# Altium footprint library 二极管封装库.PcbLib: 222 footprints (part 8 of 14)
Each footprint in its own frame and in the unit in brackets; x right, y up, seen from the top. Pads: shape width x height; smd on the part's side, far side on the other; paste and mask are expansions set on the pad; w line width, h text height; cw(c..) or ccw(c..) is an arc to the next point about the centre after c.
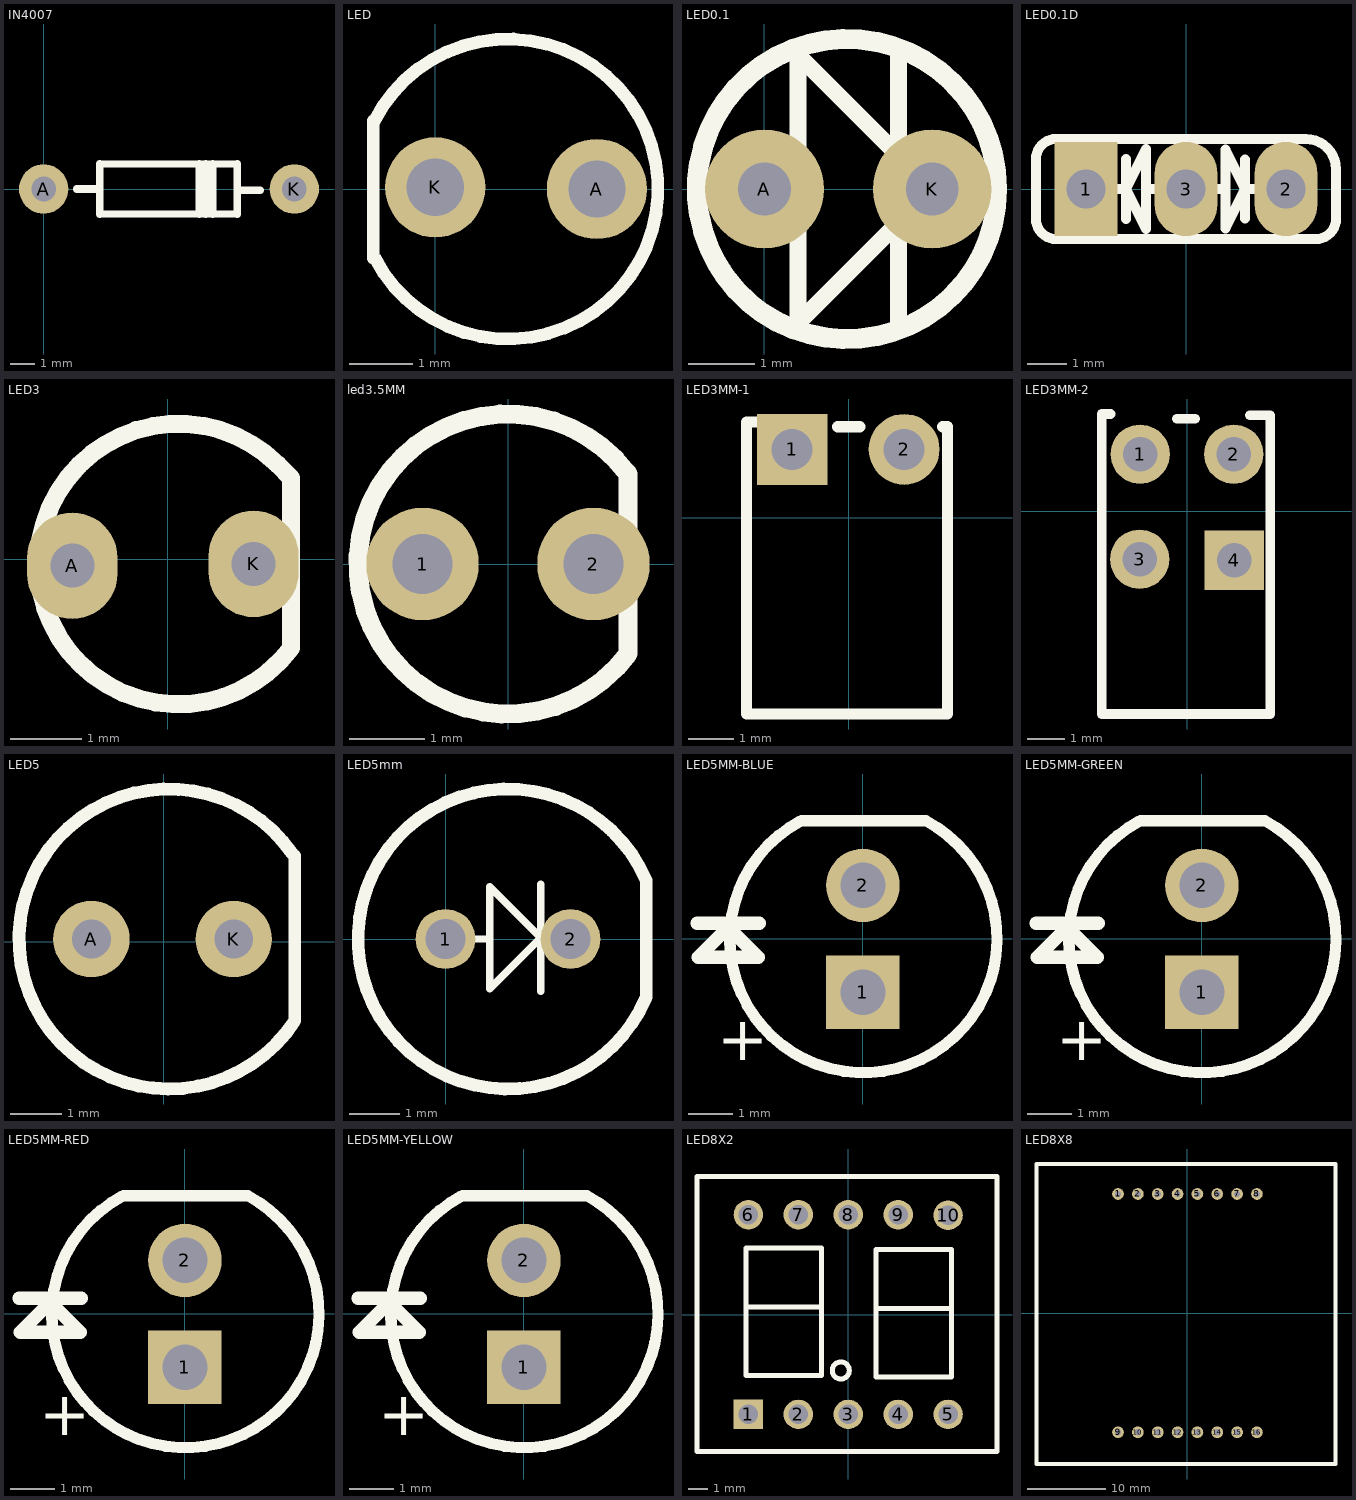
[diagram p7: the footprints below, top view; thin cyan lines are the x and y axes]

## IN4007 [mm]
pads (2):
  round 2 hole 1: A(0,0) K(10.16,0)
Top Overlay:
  lines w0.305: 1.35,0 2.282,0 ; 2.282,-1.016 2.282,1.016 ; 2.289,-1.007 7.841,-1.014 ; 2.289,1.007 7.841,1.014 ; 6.3,-1.016 6.3,1.016 ; 6.575,-1.016 6.575,1.016 ; 6.85,-1.016 6.85,1.016 ; 7.853,-1.016 7.853,1.016 ; 7.853,-0.05 8.785,-0.05

## LED [mil]
pads (2):
  round 62 hole 35.43: A(100,0) K(0,1)
Top Overlay:
  lines w7.87: -38.34,-42.75 -38.34,42.08 ; -37.62,42.22 cw(c45,0) -37.34,-42.75

## LED0.1 [mm]
pads (2):
  round 1.8 hole 0.8: A(0,0) K(2.54,0)
Top Overlay:
  circle w0.305: c1.25,0 r2.272
  lines w0.254: 2.032,-2.032 2.032,2.032 ; 2.032,-0.508 0.508,-2.032 0.508,2.032 2.032,0.508

## LED0.1D [mm]
pads (3):
  rect 1.6x2.4 hole 1: 1(-2.54,0)
  oval 1.6x2.4 hole 1: 2(2.54,0) 3(0,0)
Top Overlay:
  lines w0.254: -2.032,0 -1.524,0 ; -1.524,-0.762 -1.524,0.762 ; -1.016,0 -0.508,0 ; 0.762,0 1,0 ; 1.496,-0.754 1.496,0.746 ; 2.032,0 1.5,0 ; -1.524,0 -1.016,1.016 -1.016,-1.016 -1.524,0 ; 1,1 1.5,0 ; 1,1 1.5,0 ; 1,1 1,-1 1.5,0 ; -3.81,-0.762 ccw(c-3.302,-0.762) -3.302,-1.27 3.302,-1.27 ccw(c3.302,-0.762) 3.81,-0.762 3.81,0.508 ccw(c3.048,0.508) 3.048,1.27 -3.302,1.27 ccw(c-3.302,0.762) -3.81,0.762 -3.81,-0.762

## LED3 [mil]
pads (2):
  oval 50x59.06 hole 24.41: A(-53,-3.5) K(47.5,-2.5)
Top Overlay:
  lines w10: 60.96,52.46 ccw(c5.96,-2.54) 68.18,-49.21 68.18,45.23 60.96,52.46

## led3.5MM [mm]
pads (2):
  round 1.5 hole 0.8: 1(-1.14,0) 2(1.14,0)
Top Overlay:
  lines w0.254: 1.591,1.212 ccw(c0,0) 1.603,-1.196 1.603,1.2

## LED3MM-1 [mil]
pads (2):
  rect 62x62 hole 36 mask+5: 1(-49.5,60)
  round 62 hole 36 mask+5: 2(48.5,60)
Top Overlay:
  lines w10: -80.5,84 -89.5,84 -89.5,-171.76 86.5,-171.76 86.5,80 82.5,80 ; -9.5,80 9.5,80
3D body "1LED.STEP": height 290.42, standoff -135.56, extent -87.58,-433 89.58,73.69

## LED3MM-2 [mil]
pads (4):
  round 62 hole 36 mask+5: 1(-49.5,60) 2(48.5,60) 3(-50,-50)
  rect 62x62 hole 36 mask+5: 4(49,-51)
Top Overlay:
  lines w10: -80.5,102.01 -89.5,102.01 -89.5,-212 86.5,-212 86.5,100.5 65,100.5 ; -11,97 8,97
3D body "22LED.step": height 386.81, standoff -118.31, extent -87,-322.01 83.08,102.01

## LED5 [mm]
pads (2):
  round 1.5 hole 0.762: A(-1.416,0.054) K(1.378,0.054)
Top Overlay:
  lines w0.254: 2.525,1.738 ccw(c0.108,0.054) 2.578,-1.551 2.578,1.685

## LED5mm [mm]
pads (2):
  round 1.2 hole 0.8: 1(0,0) 2(2.5,0)
Top Overlay:
  lines w0.15: 0,0 0.889,0 ; 1.905,-1.041 1.905,1.092 ; 2.475,0.025 1.905,0.025 ; 1.905,0.025 0.889,-0.991 0.889,1.041 1.905,0.025
  lines w0.254: 4.007,1.184 ccw(c1.25,0) 4.016,-1.161 4.016,1.174

## LED5MM-BLUE [mil]
pads (2):
  rect 64.96x65 hole 40 mask+1.18: 1(0,-47.24)
  oval 64.96x65 hole 40 mask+1.18: 2(0,47.24)
Top Overlay:
  lines w10: -55.13,104.08 ccw(c0.34,-0.19) 55.55,104.22 -54.25,104.22
  lines w11.81: -146.66,13.81 -91.66,13.81 ; -145.66,-16.19 -119.16,10.31 -92.66,-16.19 -102.66,-16.19 -145.66,-16.19
  text "+" at -128.66,-107.19 h39.37
3D body "LED5_BLUE.STEP": height 338.58, standoff -78.74, extent -112.2,-111.2 112.19,99.44

## LED5MM-GREEN [mil]
pads (2):
  rect 64.96x65 hole 40 mask+1.18: 1(0,-47.24)
  oval 64.96x65 hole 40 mask+1.18: 2(0,47.24)
Top Overlay:
  lines w10: -55.13,104.08 ccw(c0.34,-0.19) 55.55,104.22 -54.25,104.22
  lines w11.81: -146.66,13.81 -91.66,13.81 ; -145.66,-16.19 -119.16,10.31 -92.66,-16.19 -102.66,-16.19 -145.66,-16.19
  text "+" at -128.66,-107.19 h39.37
3D body "LED5_GRE.STEP": height 346.46, standoff -70.87, extent -113,-110.32 111.39,100.32

## LED5MM-RED [mil]
pads (2):
  rect 64.96x65 hole 40 mask+1.18: 1(0,-47.24)
  oval 64.96x65 hole 40 mask+1.18: 2(0,47.24)
Top Overlay:
  lines w10: -55.13,104.08 ccw(c0.34,-0.19) 55.55,104.22 -54.25,104.22
  lines w11.81: -146.66,13.81 -91.66,13.81 ; -145.66,-16.19 -119.16,10.31 -92.66,-16.19 -102.66,-16.19 -145.66,-16.19
  text "+" at -128.66,-107.19 h39.37
3D body "LED5_RED.STEP": height 338.58, standoff -78.74, extent -112.05,-113.82 112.34,96.81

## LED5MM-YELLOW [mil]
pads (2):
  rect 64.96x65 hole 40 mask+1.18: 1(0,-47.24)
  oval 64.96x65 hole 40 mask+1.18: 2(0,47.24)
Top Overlay:
  lines w10: -55.13,104.08 ccw(c0.34,-0.19) 55.55,104.22 -54.25,104.22
  lines w11.81: -146.66,13.81 -91.66,13.81 ; -145.66,-16.19 -119.16,10.31 -92.66,-16.19 -102.66,-16.19 -145.66,-16.19
  text "+" at -128.66,-107.19 h39.37
3D body "LED5_YEL.STEP": height 338.58, standoff -78.74, extent -112.2,-111.2 112.2,99.43

## LED8X2 [mm] "DIP; 16 Leads; Row Spacing 7.62 mm; Pitch 2.54 mm"
pads (10):
  rect 1.5x1.5 hole 1: 1(-5.08,-5.08)
  round 1.5 hole 1: 2(-2.54,-5.08) 3(0,-5.08) 4(2.54,-5.08) 5(5.08,-5.08) 6(-5.08,5.08) 7(-2.54,5.08) 8(0,5.08) 9(2.54,5.08) 10(5.08,5.049)
Top Overlay:
  circle w0.254: c-0.381,-2.845 r0.434
  lines w0.254: -5.156,0.381 -1.372,0.381 ; 1.473,0.305 5.258,0.305 ; -7.696,-6.96 7.569,-6.96 7.569,7.015 -7.696,7.015 -7.696,-6.96 ; -5.207,-3.099 -5.207,3.378 -1.372,3.378 -1.372,-3.099 -5.207,-3.099 ; 1.422,-3.175 5.258,-3.175 5.258,3.302 1.422,3.302 1.422,-3.175
3D body "LED Digital Tube 8X2.STEP": height 7.2, standoff -1.9, extent -7.551,-6.985 7.449,7.015

## LED8X8 [mm]
pads (16):
  round 1.5 hole 0.8: 1(-8.89,15.253) 2(-6.35,15.253) 3(-3.81,15.253) 4(-1.27,15.253) 5(1.27,15.253) 6(3.81,15.253) 7(6.35,15.253) 8(8.89,15.253) 9(-8.89,-15.253) 10(-6.35,-15.253) 11(-3.81,-15.253) 12(-1.27,-15.253) 13(1.27,-15.253) 14(3.81,-15.253) 15(6.35,-15.253) 16(8.89,-15.253)
Top Overlay:
  lines w0.508: -19.355,-19.317 18.974,-19.317 18.974,19.088 -19.355,19.088 -19.355,-19.317
3D body "38x38_8x8_LED.step": height 10.4, standoff -4, extent -19.3,-19.313 19,18.987